# Altium footprint library MyPcbLib.PcbLib: 657 footprints (part 25 of 42)
Each footprint in its own frame and in the unit in brackets; x right, y up, seen from the top. Pads: shape width x height; smd on the part's side, far side on the other; paste and mask are expansions set on the pad; w line width, h text height; cw(c..) or ccw(c..) is an arc to the next point about the centre after c.
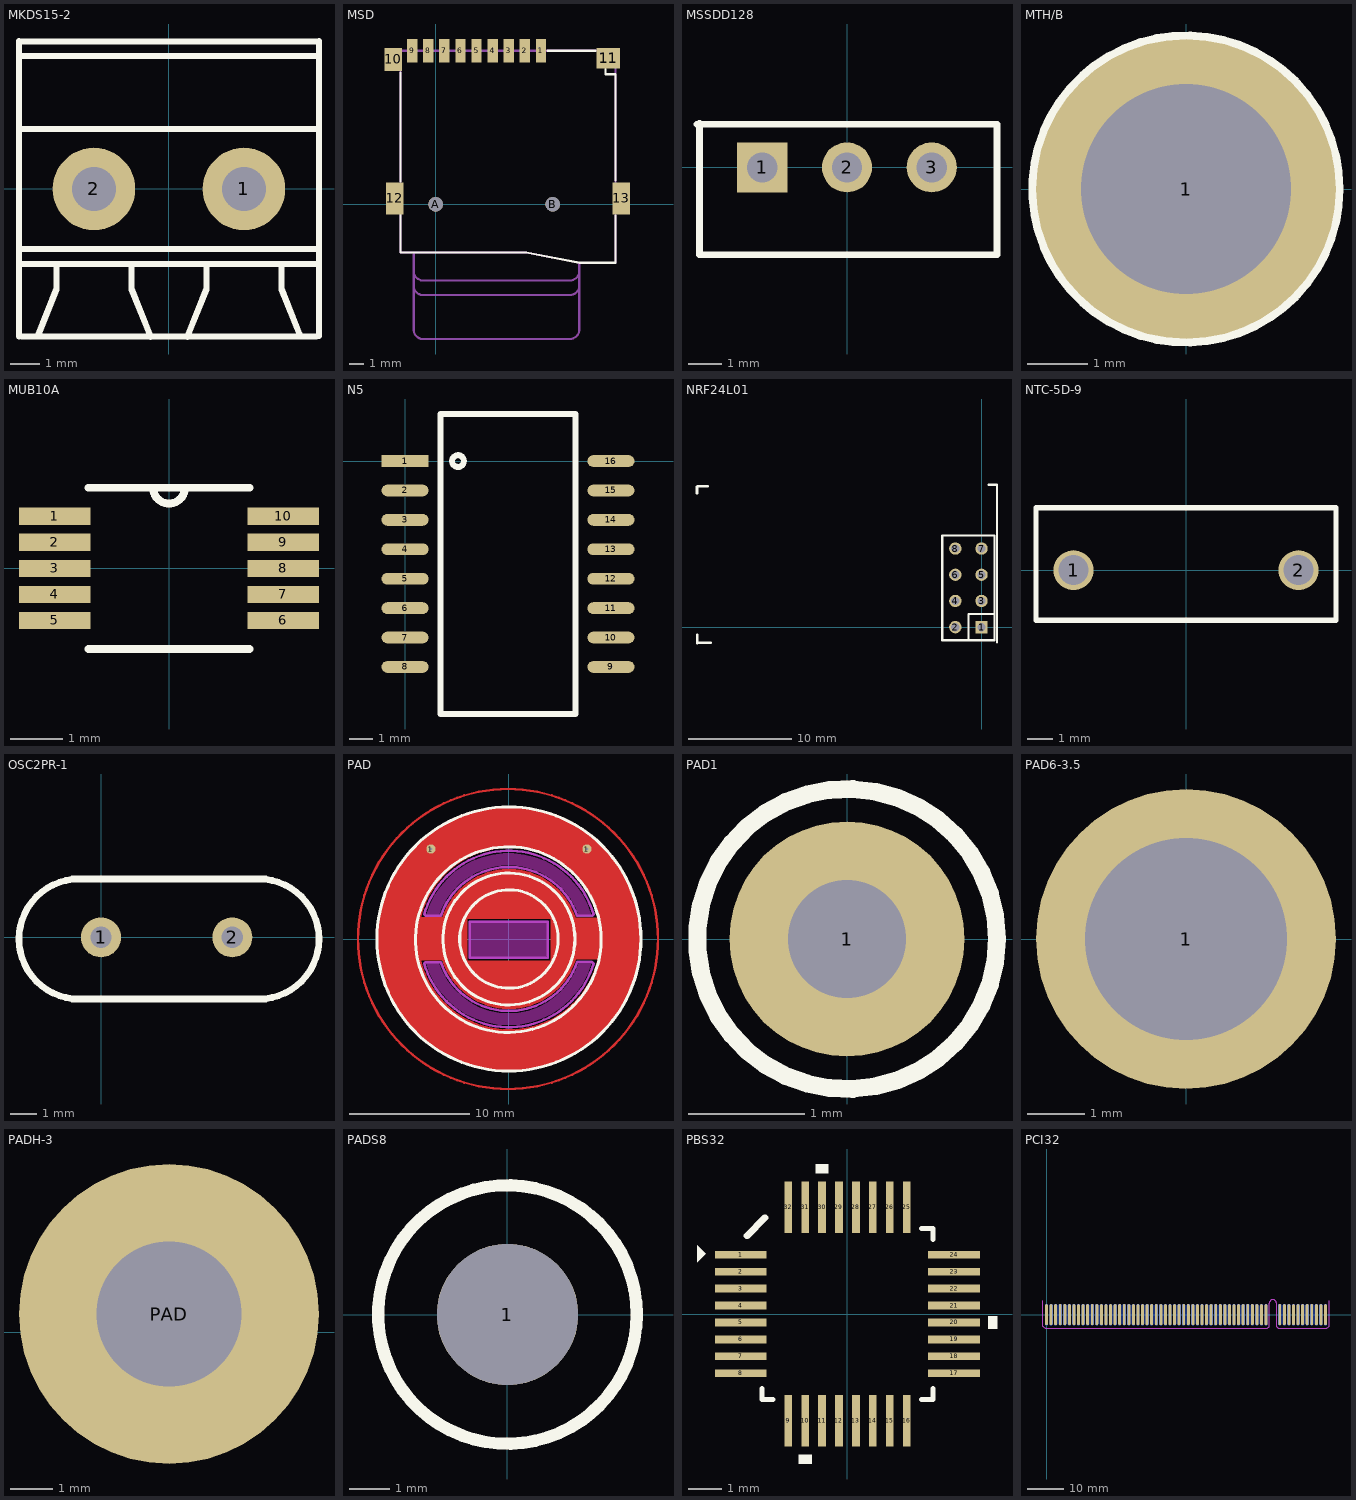
[diagram p24: the footprints below, top view; thin cyan lines are the x and y axes]

## MKDS15-2 [mil]
pads (2):
  round 110 hole 59.05: 1(100,0) 2(-100,0)
Top Overlay:
  lines w8: -200,-197 -200,197 ; -200,-100 200,-100 ; -200,-80 200,-80 ; -200,80 200,80 ; -200,177 200,177 ; -196.85,-196.85 196.85,-196.85 ; -196.85,196.85 196.85,196.85 ; -175.4,-196.84 -150,-133.33 -150,-100 ; -50,-100 -50,-133.33 -24.53,-197.01 ; 24.53,-197.01 50,-133.33 50,-100 ; 150,-100 150,-133.33 174.37,-194.25 ; 200,-196 200,197
3D body: height 551.18, standoff -78.74, extent -195.85,-198 197.85,195.7

## MSD [mm]
pads (15):
  rect 0.7x1.6 smd: 1(7.2,10.5) 2(6.1,10.5) 3(5,10.5) 4(3.9,10.5) 5(2.8,10.5) 6(1.7,10.5) 7(0.6,10.5) 8(-0.5,10.5) 9(-1.6,10.5)
  rect 1.2x1.6 smd: 10(-2.902,9.902)
  rect 1.6x1.4 smd: 11(11.8,10)
  rect 1.2x2.2 smd: 12(-2.8,0.4) 13(12.7,0.4)
  round 1 hole 1: A(0,0) B(8,0)
Top Overlay:
  lines w0.152: -2.4,-0.716 -2.4,-3.296 6.192,-3.296 9.842,-3.993 12.303,-3.993 12.303,-0.774 ; -2.4,1.572 -2.4,9.009 ; 7.643,10.499 10.922,10.499 ; 11.613,9.249 11.613,8.891 12.302,8.891 12.302,1.623
Mechanical 1:
  lines w0.152: -1.492,-5.516 ccw(c-0.861,-5.567) -0.912,-6.198 9.232,-6.198 ; -1.492,-4.518 ccw(c-0.861,-4.568) -0.912,-5.2 9.232,-5.2 ccw(c9.182,-4.569) 9.813,-4.518 ; -1.492,-3.305 -1.492,-8.518 ccw(c-0.861,-8.569) -0.912,-9.2 9.232,-9.2 ccw(c9.182,-8.569) 9.813,-8.518 9.813,-4 ; 9.232,-6.198 ccw(c9.182,-5.567) 9.813,-5.516 ; 9.813,-4 12.3,-4 12.3,10.5 -2.4,10.5 -2.4,-3.3 6.214,-3.3 9.813,-4

## MSSDD128 [mm]
pads (3):
  rect 1.5x1.5 hole 0.9: 1(-2.54,0)
  round 1.5 hole 0.9: 2(0,0) 3(2.54,0)
Top Overlay:
  lines w0.203: -4.496,1.295 4.496,1.295 4.496,-2.616 -4.42,-2.616 -4.42,1.321
3D body: height 4, standoff -2, extent -4.5,-4.821 4.5,0.179

## MTH/B [mm]
pads (1):
  round 5 hole 3.5: 1(0,0)
Top Overlay:
  circle w0.254: c0,0 r2.5

## MUB10A [mil]
pads (10):
  rect 54x13 smd: 1(-86.5,39.4) 2(-86.5,19.7) 3(-86.5,0) 4(-86.5,-19.7) 5(-86.5,-39.4) 6(86.5,-39.4) 7(86.5,-19.7) 8(86.5,0) 9(86.5,19.7) 10(86.5,39.4)
Top Overlay:
  lines w6: -61,-61 61,-61 ; -61,61 61,61 ; -12,61 ccw(c0,61) 12,61

## N5 [mil]
pads (16):
  rect 80x20 smd: 1(0,0)
  oval 80x20 smd: 2(0,-50) 3(0,-100) 4(0,-150) 5(0,-200) 6(0,-250) 7(0,-300) 8(0,-350) 9(350,-350) 10(350,-300) 11(350,-250) 12(350,-200) 13(350,-150) 14(350,-100) 15(350,-50) 16(350,0)
Top Overlay:
  circle w10: c90,0 r10
  lines w10: 60,-430 290,-430 290,80 60,80 60,-430

## NRF24L01 [mm]
pads (8):
  rect 1.2x1.2 hole 0.8: 1(0,0)
  round 1.2 hole 0.8: 2(-2.54,0) 3(0,2.54) 4(-2.54,2.54) 5(0,5.08) 6(-2.54,5.08) 7(0,7.62) 8(-2.54,7.62)
Top Overlay:
  lines w0.203: -1.27,-1.27 -1.27,1.27 1.27,1.27 ; 1.245,8.89 -3.81,8.89 -3.81,-1.27 1.27,-1.27 1.27,8.89 ; 1.5,-1.5 1.5,13.727
  lines w0.254: -27.584,12.979 -27.584,13.614 ; -27.559,-1.549 -27.559,-0.737 ; -27.508,-1.524 -26.264,-1.524 ; -27.508,13.665 -26.543,13.665 ; 0.711,13.792 1.473,13.792

## NTC-5D-9 [mm]
pads (2):
  round 1.6 hole 1.2: 1(-4.5,0) 2(4.5,0)
Top Overlay:
  lines w0.203: -6,-2 6,-2 6,2.5 -6,2.5 -6,-2

## OSC2PR-1 [mil]
pads (2):
  round 60 hole 32: 1(-0.32,-0.02) 2(196.69,-0.02)
Top Overlay:
  lines w10: -43.31,-92.52 246.69,-92.52 ; -43.31,87.48 246.69,87.48 ; -33.32,-92.52 cw(c-33.31,-2.52) -33.31,87.48 ; 236.68,-92.52 ccw(c236.69,-2.52) 236.69,87.48

## PAD [mil]
pads (2):
  round 30 hole 10: 1(-255.91,295.28) 1(255.91,295.28)
Top Layer:
  circle w74.8: c0,0 r192.91
  circle w137.8: c1,1 r366.14
  circle w8: c-3,0 r492.13
  rectangle: -213,-87 -136,68
  rectangle: 136,-73 213,74
  rectangle: -314,-70 -201,72
  rectangle: 201,-67 326,70
  rectangle: -138,-172 144,-70
  rectangle: -148,65 138,164
Top Overlay:
  circle w10: c-2,-2 r304.61
  circle w10: c0,0 r433.07
  circle w10: c0,0 r161.42
  circle w10: c0,0 r216.54
Keep-Out Layer:
  board cut-out: -0.72,-243.85 32.7,-241.54 65.48,-234.67 97,-223.35 126.67,-207.8 153.92,-188.33 178.24,-165.29 199.16,-139.13 216.28,-110.35 229.29,-79.48 270.57,-79.48 258.2,-113.68 241.55,-146.01 220.88,-175.93 196.53,-202.95 168.92,-226.61 138.49,-246.54 105.76,-262.38 71.27,-273.9 35.58,-280.88 -0.72,-283.22 -37.01,-280.88 -72.7,-273.9 -107.2,-262.38 -139.93,-246.54 -170.35,-226.61 -197.96,-202.95 -222.31,-175.93 -242.98,-146.01 -259.64,-113.68 -272,-79.48 -230.72,-79.48 -217.72,-110.35 -200.59,-139.13 -179.67,-165.29 -155.36,-188.33 -128.11,-207.8 -98.44,-223.35 -66.91,-234.67 -34.13,-241.54
  board cut-out: -272,78 -260.32,110.61 -244.74,141.55 -225.5,170.34 -202.87,196.57 -177.2,219.82 -148.88,239.76 -118.33,256.09 -86.01,268.55 -52.41,276.97 -18.04,281.21 16.6,281.21 50.98,276.97 84.58,268.55 116.9,256.09 147.45,239.76 175.77,219.82 201.44,196.57 224.06,170.34 243.31,141.55 258.89,110.61 270.57,78 229.29,78 217.07,107.29 201.15,134.74 181.78,159.88 159.3,182.28 134.1,201.56 106.6,217.4 77.27,229.52 46.62,237.72 15.15,241.85 -16.58,241.85 -48.05,237.72 -78.7,229.52 -108.03,217.4 -135.53,201.56 -160.74,182.28 -183.21,159.88 -202.58,134.74 -218.51,107.29 -230.72,78
  board cut-out: -127.72,57.26 126.28,57.26 126.28,-56.74 -127.72,-56.74 -127.72,55.26 -128.72,56.26
Keep-Out Layer:
  lines w8: -278,-79 -277,-79 -274,-76 -222,-76 ; -277.9,-80.66 ccw(c0,0) 277.9,-80.66 ; -223.49,-76.51 ccw(c0,0) 223.49,-76.51 273.51,-76.51 277,-80 ; 223,77 274,77 277,80 ; 223.49,76.51 ccw(c0,0) -223.49,76.51 -273.75,76.51 -277.9,80.66 cw(c0,0) 277.9,80.66 ; -127.84,-61.31 128.07,-61.31 128.07,56.8 -127.84,56.8 -127.84,-61.31
Mechanical 1:
  lines w8: -277.9,80.66 cw(c0,0) 277.9,80.66 273.75,76.51 223.49,76.51 ccw(c0,0) -223.49,76.51 -273.51,76.51 -277,80 ; 223.49,-76.51 cw(c0,0) -223.49,-76.51 -273.75,-76.51 -277.9,-80.66 ccw(c0,0) 277.9,-80.66 272.24,-75 224,-75 ; -127.84,-61.31 -127.84,56.8 128.07,56.8 128.07,-61.31 -127.84,-61.31

## PAD1 [mil]
pads (1):
  round 80 hole 40: 1(0,0)
Top Overlay:
  circle w6.06: c0,0 r51

## PAD6-3.5 [mm]
pads (1):
  round 5.2 hole 3.5: 1(0,0)

## PADH-3 [mil]
pads (1):
  round 280 hole 135: PAD(417,17)

## PADS8 [mm]
pads (1):
  round 3.5 hole 3.5: 1(0,0)
Top Overlay:
  circle w0.305: c0,0 r3.2
Bottom Solder:
  circle w1: c2.413,-2.159 r0.5
  circle w1: c3.226,0.102 r0.5
  circle w1: c2.3,2.3 r0.5
  circle w1: c0.127,3.226 r0.5
  circle w1: c-2.2,2.4 r0.5
  circle w1: c-3.2,0 r0.5
  circle w1: c-2.007,-2.438 r0.5
  circle w1: c0.381,-3.2 r0.5

## PBS32 [mil]
height 47
pads (32):
  rect 60x9 smd: 1(-124,68.9) 2(-124,49.21) 3(-124,29.53) 4(-124,9.84) 5(-124,-9.84) 6(-124,-29.53) 7(-124,-49.21) 8(-124,-68.9) 17(124,-68.9) 18(124,-49.21) 19(124,-29.53) 20(124,-9.84) 21(124,9.84) 22(124,29.53) 23(124,49.21) 24(124,68.9)
  rect 9x60 smd: 9(-68.9,-124) 10(-49.21,-124) 11(-29.53,-124) 12(-9.84,-124) 13(9.84,-124) 14(29.53,-124) 15(49.21,-124) 16(68.9,-124) 25(68.9,124) 26(49.21,124) 27(29.53,124) 28(9.84,124) 29(-9.84,124) 30(-29.53,124) 31(-49.21,124) 32(-68.9,124)
Top Overlay:
  region: -175,80 -175,60 -165,70
  region: -41.71,-164 -56.71,-164 -56.71,-174 -41.71,-174
  region: 164,-2.34 174,-2.34 174,-17.34 164,-17.34
  region: -22.03,164 -37.03,164 -37.03,174 -22.03,174
  lines w6: -99.5,-86.5 -99.5,-99.5 -86.5,-99.5 ; 86.5,-99.5 99.5,-99.5 99.5,-86.5 ; 86.5,99.5 99.5,99.5 99.5,86.5
  lines w8: -117,91 -96,112

## PCI32 [mil]
pads (120):
  oval 32x230 smd: 1(0,0) 2(50,0) 3(100,0) 4(150,0) 5(200,0) 6(250,0) 7(300,0) 8(350,0) 9(400,0) 10(450,0) 11(500,0) 12(550,0) 13(600,0) 14(650,0) 15(700,0) 16(750,0) 17(800,0) 18(850,0) 19(900,0) 20(950,0) 21(1000,0) 22(1050,0) 23(1100,0) 24(1150,0) 25(1200,0) 26(1250,0) 27(1300,0) 28(1350,0) 29(1400,0) 30(1450,0) 31(1500,0) 32(1550,0) 33(1600,0) 34(1650,0) 35(1700,0) 36(1750,0) 37(1800,0) 38(1850,0) 39(1900,0) 40(1950,0) 41(2000,0) 42(2050,0) 43(2100,0) 44(2150,0) 45(2200,0) 46(2250,0) 47(2300,0) 48(2350,0) 49(2400,0) 52(2550,0) 53(2600,0) 54(2650,0) 55(2700,0) 56(2750,0) 57(2800,0) 58(2850,0) 59(2900,0) 60(2950,0) 61(3000,0) 62(3050,0)
  oval 32x230 smd far side: 63(3050,0) 64(3000,0) 65(2950,0) 66(2900,0) 67(2850,0) 68(2800,0) 69(2750,0) 70(2700,0) 71(2650,0) 72(2600,0) 73(2550,0) 76(2400,0) 77(2350,0) 78(2300,0) 79(2250,0) 80(2200,0) 81(2150,0) 82(2100,0) 83(2050,0) 84(2000,0) 85(1950,0) 86(1900,0) 87(1850,0) 88(1800,0) 89(1750,0) 90(1700,0) 91(1650,0) 92(1600,0) 93(1550,0) 94(1500,0) 95(1450,0) 96(1400,0) 97(1350,0) 98(1300,0) 99(1250,0) 100(1200,0) 101(1150,0) 102(1100,0) 103(1050,0) 104(1000,0) 105(950,0) 106(900,0) 107(850,0) 108(800,0) 109(750,0) 110(700,0) 111(650,0) 112(600,0) 113(550,0) 114(500,0) 115(450,0) 116(400,0) 117(350,0) 118(300,0) 119(250,0) 120(200,0) 121(150,0) 122(100,0) 123(50,0) 124(0,0)
Top Solder:
  rectangle: -40,-150 2435,120
  rectangle: 2515,-150 3090,120
Bottom Solder:
  rectangle: 2515,-150 3090,120
  rectangle: -40,-150 2435,120
Keep-Out Layer:
  lines w10: -40,150 -40,-125 -15,-150 2415,-150 2435,-130 2435,125 cw(c2475,125) 2515,125 2515,-130 2535,-150 3065,-150 3090,-125 3090,150
Mechanical 1:
  lines w10: -40,150 -40,-125 -15,-150 2415,-150 2435,-130 2435,125 cw(c2475,125) 2515,125 2515,-130 2535,-150 3065,-150 3090,-125 3090,150